# Altium integrated library OMID_DXP_LIB93.IntLib: 684 symbols (part 1 of 5) (continued)
## LCD 8X2 (continued)
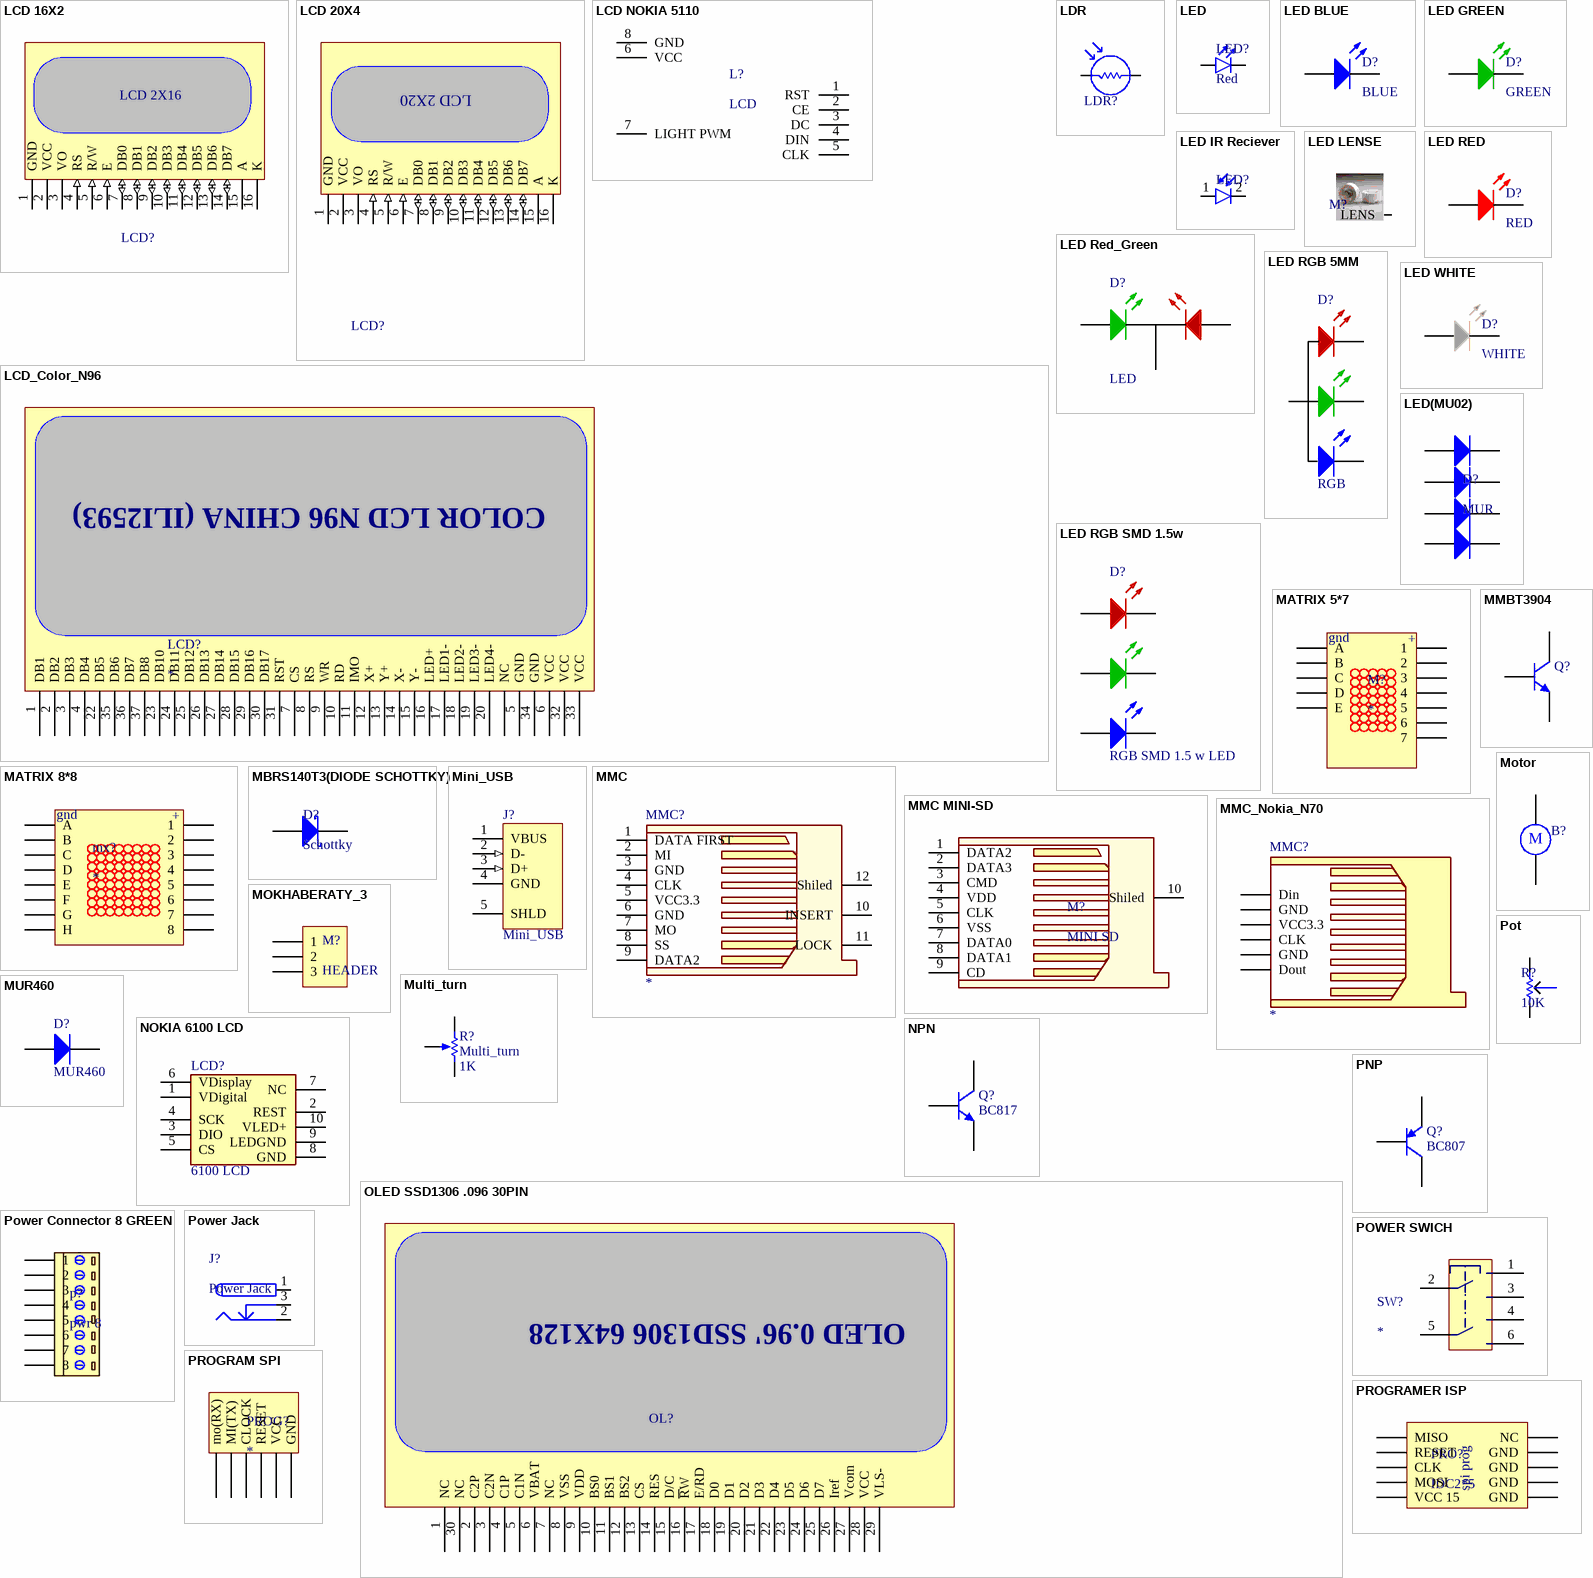
[diagram p4: symbols LCD 16X2 to PROGRAMER ISP]
text: LCD 2X8

## LCD 16X2
designator LCD?  (value not drawn)
LCD 16X2 Character lcd
footprint My_LCD 16x2-A
footprint LCD2*16_VERTICAL
pins: 1 GND (power), 2 VCC (power), 3 VO, 4 RS (in), 5 R/W (in), 6 E (in), 7 DB0 (io), 8 DB1 (io), 9 DB2 (io), 10 DB3 (io), 11 DB4 (io), 12 DB5 (io), 13 DB6 (io), 14 DB7 (io), 15 A, 16 K
text: LCD 2X16

## LCD 20X4
designator LCD?  (value not drawn)
LCD 20X4 Character lcd
footprint My_LCD 20x4-A
footprint My_LCD 20x4-B
pins: 1 GND (power), 2 VCC (power), 3 VO, 4 RS (in), 5 R/W (in), 6 E (in), 7 DB0 (io), 8 DB1 (io), 9 DB2 (io), 10 DB3 (io), 11 DB4 (io), 12 DB5 (io), 13 DB6 (io), 14 DB7 (io), 15 A, 16 K
text: LCD 2X20

## LCD NOKIA 5110
designator L?, comment LCD
48X84 LCD MATRIX
footprint LCD_MODULE5110
pins: 1 RST, 2 CE, 3 DC, 4 DIN, 5 CLK, 6 VCC (power), 7 LIGHT PWM, 8 GND (power)

## LCD_Color_N96
designator LCD?
footprint my_lcd_N96
pins: 1 DB1, 2 DB2, 3 DB3, 4 DB4, 5 GND, 6 VCC, 7 CS, 8 RS, 9 WR, 10 RD, 11 IMO, 12 X+, 13 Y+, 14 X-, 15 Y-, 16 LED+, 17 LED1-, 18 LED2-, 19 LED3-, 20 LED4-, 21 NC, 22 DB5, 23 DB10, 24 DB11, 25 DB12, 26 DB13, 27 DB14, 28 DB15, 29 DB16, 30 DB17, 31 RST, 32 VCC, 33 VCC, 34 GND, 35 DB6, 36 DB7, 37 DB8
text: COLOR LCD N96 CHINA (ILI2593)

## LDR
designator LDR?, comment PhotoCell  (value not drawn)
Photo Cell- Variable Resistor With Light; Company: IPA CO.; Designer: Saeid Jorablo; Last Update Time: 2008/07/17
footprint PhotoCell
pins: 1, 2

## LED
designator LED?, comment Red
LED; Designer: Saeid Jorablo; Organazation: ControTec; Adding Date: 1387/12/22; Size: SMD 1206; Color: Red
footprint LED-3mm
footprint LED-5mm
footprint LED-5mm-IR
footprint LED SMD 1206
footprint LED-RED (LED 3mm Right Angle - Color Red)
footprint LED-GREEN (LED 3mm Right Angle - Color Green)
footprint LED-YELLOW (LED 3mm Right Angle - Color Yellow)
footprint LED 1Watt
pins: 1 A, 2 K

## LED BLUE
designator D?, comment BLUE
LED SMD PACKAGE
footprint 0603 (Chip Capacitor; Body 1.6 x 0.8 mm (LxW typ))
footprint 0805 (Chip Capacitor; Body 2.0 x 1.2 mm (LxW typ))
footprint 1206 (Chip Capacitor; Body 3.2 x 1.6 mm (LxW typ))
footprint LED SMD 1206 BLUE
footprint LED-5mm-BLUE
footprint Model Name (Footprint not found)
pins: 1 A, 2 K

## LED GREEN
designator D?, comment GREEN
LED SMD PACKAGE
footprint 0603 (Chip Capacitor; Body 1.6 x 0.8 mm (LxW typ))
footprint 0805 (Chip Capacitor; Body 2.0 x 1.2 mm (LxW typ))
footprint LED SMD 1206 GREEN
footprint LED-3mm
footprint LED-Green (LED 3mm Right Angle - Color Green)
footprint LED-5mm-Green
pins: 1 A, 2 K

## LED IR Reciever
designator LED?, comment IR Reciever  (value not drawn)
Infra Red Reciever Photo Diode; Designer: Saeid Jorablo; Organazation: ControTec; Adding Date: 1387/12/22
footprint LED-5mm-IR Reciver
footprint LED-5mm-IR
pins: 1 A, 2 K

## LED LENSE
designator M?, comment LENSE  (value not drawn)
LED COVER LENSE
footprint LED LESE
pins: G LENS

## LED RED
designator D?, comment RED
LED SMD PACKAGE
footprint 0603 (Chip Capacitor; Body 1.6 x 0.8 mm (LxW typ))
footprint 0805 (Chip Capacitor; Body 2.0 x 1.2 mm (LxW typ))
footprint 1206 (Chip Capacitor; Body 3.2 x 1.6 mm (LxW typ))
footprint LED SMD 1206
footprint LED-Red (LED 3mm Right Angle - Color Red)
footprint LED-5mm-RED
pins: 1 A, 2 K

## LED Red_Green
designator D?, comment LED
Typical INFRARED GaAs LED; Published: 8-Jun-2000; LatestRevisionDate: 08-Jul-2005; LatestRevisionNote: Mech Layer 1 removed.; Publisher: Altium Limited
footprint My_DUOLED5MM
pins: AG, AR, K

## LED RGB 5MM
designator D?, comment RGB
Enhanced Power RGB LED
footprint LED-RGB-5MM
pins: A, B K, G K, R K

## LED RGB SMD 1.5w
designator D?, comment RGB SMD 1.5 w LED
Enhanced Power RGB LED
footprint MY_RGB_SMD_1.5w
pins: AB A, AG A, AR A, KB K, KG K, KR K

## LED WHITE
designator D?, comment WHITE
LED SMD PACKAGE
footprint 0603 (Chip Capacitor; Body 1.6 x 0.8 mm (LxW typ))
footprint 0805 (Chip Capacitor; Body 2.0 x 1.2 mm (LxW typ))
footprint 1206 (Chip Capacitor; Body 3.2 x 1.6 mm (LxW typ))
footprint LED SMD 1206 WHITE
footprint LED-5mm-IR
pins: 1 A, 2 K

## LED(MU02)
designator D?, comment MUR
4 LED IN INTEGRED PACKAGE
footprint MU02
pins: 1, 2 B, 3 A, 4 A, A K, B K, C K, D K

## MATRIX 5*7
designator M?
MATRIX
footprint my_MATRIX 5*7
pins: 1, 2, 3, 4 (power), 5 (power), 6 (power), 7 (power), A, B, C, D, E
text: gnd; +

## MATRIX 8*8
designator mx?
MATRIX RED
footprint my_dotmatrix8*8
pins: A1 1, A2 2, A3 3, A4 4 (power), A5 5 (power), A6 6 (power), A7 7 (power), A8 8 (power), K1 A, K2 B, K3 C, K4 D, K5 E, K6 F, K7 G, K8 H
text: gnd; +

## MBRS140T3(DIODE SCHOTTKY)
designator D?, comment Schottky
Schottky Power Rectifier
footprint 403A-3
pins: 1 A, 2 K

## Mini_USB
designator J?
USB 2.0, Right Angle, SMT, B Type, Receptacle, 5 Position, Black; ContactMaterial: Copper Alloy; ContactPlating: Gold (30); PCB_Layout: Complies with manufacturer's recommendation.; DrillSize: Corresponds to nominal value.; PanelGround: Without; Published: 15-Jul-2004; DatasheetDocument: 27-Jun-2003; PackageDocument: 27-Jun-2003; PackageReference: 440247; Publisher: Altium Limited; HousingMaterial: Thermoplastic; ComponentLink1Description: Manufacturer Link; ComponentLink1URL: http://www.tycoelectronics.com/; ComponentLink2Description: Packaging Specification; ComponentLink2URL: http://ecommas.tycoelectronics.com/commerce/DocumentDelivery/DDEController?Action=showdoc&DocId=Customer+Drawing%7F440247%7FD%7Fpdf%7FEnglish%7FC_440247_D.pdf
footprint My_USB
signal-integrity model USB2.0
pins: 1 VBUS (power) "Power", 2 D- (in) "-DATA", 3 D+ (in) "+DATA", 4 GND (power) "Ground", 5 SHLD "Shield"

## MMBT3904
designator Q?
NPN Switching Transistor; Published: 17-Sep-2003; LatestRevisionDate: 12-Dec-2006; LatestRevisionNote: IPC-7351 Footprint Added.; DatasheetVersion: 13-May-2002; PackageVersion: May-1999; PackageReference: SOT23; Publisher: Altium Limited; PackageDescription: 3-Pin SOT-23 Package 0.95 mm Pitch, 2.3 mm Lead Span; ComponentLink1Description: Manufacturer Link; ComponentLink1URL: http://www.semiconductors.philips.com/; ComponentLink2Description: Datasheet; ComponentLink2URL: http://www.semiconductors.philips.com/acrobat/datasheets/MMBT3904_4.pdf
footprint SOT23_N (SOT23, 3-Leads, Body 2.9x1.3mm, Pitch 0.95mm, Lead Span 2.3mm, IPC Medium Density)
footprint SOT23_L (SOT23, 3-Leads, Body 2.9x1.3mm, Pitch 0.95mm, Lead Span 2.3mm, IPC High Density)
footprint SOT23_M (SOT23, 3-Leads, Body 2.9x1.3mm, Pitch 0.95mm, Lead Span 2.3mm, IPC Low Density)
signal-integrity model MMBT3904
pins: 1 B, 2 E, 3 C

## MMC
designator MMC?
MMC/SD Card
footprint MY_MMC
footprint MY_SD-MMC_SOCKET-PP
footprint my_mmc mini
pins: 1 DATA FIRST, 2 MI, 3 GND, 4 CLK, 5 VCC3.3, 6 GND, 7 MO, 8 SS, 9 DATA2, 10 INSERT, 11 LOCK, 12 Shiled

## MMC MINI-SD
designator M?, comment MINI SD
MULTI MEDIA CARD SLOT SMD
footprint SD_MINI KESHOOYI
pins: 1 DATA2, 2 DATA3, 3 CMD, 4 VDD, 5 CLK, 6 VSS, 7 DATA0, 8 DATA1, 9 CD, 10 Shiled

## MMC_Nokia_N70
designator MMC?
MMC/SD Card
footprint MY_Nokia_N70_MMC
pins: 2 Din, 3 GND, 4 VCC3.3, 5 CLK, 6 GND, 7 Dout

## MOKHABERATY_3
designator M?, comment HEADER
footprint HEADER_MOKHABERATY_3
pins: 1, 2, 3

## Motor
designator B?
Motor, General Kind; Published: 24-Mar-1999; LatestRevisionDate: 17-Jul-2002; LatestRevisionNote: Re-released for DXP Platform.; PackageReference: RB5-10.5; Publisher: Altium Limited
footprint RB5-10.5 (Motor, General Kind; 2 Leads)
pins: 1, 2
text: M

## Multi_turn
designator R?  value 1K
Potentiometer MULTI TURN; Sim Note: Enter the Resistance value and the set point into parameter fields.; Set Position: 0.5; Published: 8-Jun-2000; LatestRevisionDate: 17-Jul-2002; LatestRevisionNote: Re-released for DXP Platform.; PackageReference: VR5; Publisher: Altium Limited
footprint My_Pot_trim
simulation model POT (Potentiometer)
footprint MY_MULTI
pins: 1 TOP, 2 BOT, 3 TAP
1 alternate drawing of the same symbol

## MUR460
designator D?
8Amp Diode
footprint TO220-2
pins: 1 K, 2 A

## NOKIA 6100 LCD
designator LCD?, comment 6100 LCD
NOKIA 6100 LCD
footprint MY_NOKIA6100_LCD
pins: 1 VDigital, 2 REST, 3 DIO, 4 SCK, 5 CS, 6 VDisplay, 7 NC, 8 GND, 9 LEDGND, 10 VLED+

## NPN
designator Q?, comment BC817
NPN Bipolar Transistor; Published: 8-Jun-2000; LatestRevisionDate: 29-May-2009; LatestRevisionNote: IPC-7351 Footprint Added.; PackageVersion: Aug-1999; PackageReference: SOT-23B; Publisher: Altium Limited; PackageDescription: 3-Pin SOT-23 Package 0.95 mm Pitch, 2.4 mm Lead Span
signal-integrity model NPN
footprint SOT23_BEC_L (SOT23, 3-Leads, Body 2.9x1.3mm, Pitch 0.95mm, Lead Span 2.4mm, IPC High Density)
footprint SOT23_BEC_M (SOT23, 3-Leads, Body 2.9x1.3mm, Pitch 0.95mm, Lead Span 2.4mm, IPC Low Density)
footprint SOT23_BEC_N (SOT23, 3-Leads, Body 2.9x1.3mm, Pitch 0.95mm, Lead Span 2.4mm, IPC Medium Density)
pins: 1 B, 2 E, 3 C

## OLED SSD1306 .096 30PIN
designator OL?  (value not drawn)
footprint OLED 64X128 .96
pins: 1 NC, 2 C2P, 3 C2N, 4 C1P, 5 C1N, 6 VBAT, 7 NC, 8 VSS, 9 VDD, 10 BS0, 11 BS1, 12 BS2, 13 CS, 14 RES, 15 D/C, 16 ~{R}W, 17 E/RD, 18 D0, 19 D1, 20 D2, 21 D3, 22 D4, 23 D5, 24 D6, 25 D7, 26 Iref, 27 Vcom, 28 VCC, 29 VLS-, 30 NC
text: OLED 0.96' SSD1306 64X128

## PNP
designator Q?, comment BC807
PNP Bipolar Transistor; Published: 8-Jun-2000; LatestRevisionDate: 29-May-2009; LatestRevisionNote: IPC-7351 Footprint Added.; PackageVersion: Aug-1999; PackageReference: SOT-23B; Publisher: Altium Limited; PackageDescription: 3-Pin SOT-23 Package 0.95 mm Pitch, 2.4 mm Lead Span
signal-integrity model PNP
footprint SOT23_BEC_N (SOT23, 3-Leads, Body 2.9x1.3mm, Pitch 0.95mm, Lead Span 2.4mm, IPC Medium Density)
footprint SOT23_BEC_M (SOT23, 3-Leads, Body 2.9x1.3mm, Pitch 0.95mm, Lead Span 2.4mm, IPC Low Density)
footprint SOT23_BEC_L (SOT23, 3-Leads, Body 2.9x1.3mm, Pitch 0.95mm, Lead Span 2.4mm, IPC High Density)
pins: 1 B, 2 E, 3 C

## Pot
designator R?, comment 10K
POT; VALUE: 10K
footprint my_pot - duplicate
footprint my_pot2
footprint my_vol
footprint POT-SMD
pins: 1, 2, 3

## Power Connector 8 GREEN
designator p?, comment pwr 8
GREEN Power Connector 8PIN RIGHT ANGLE
footprint my_power_8
pins: 1, 2, 3, 4, 5, 6, 7, 8

## Power Jack
designator J?
Designer: Saeid Jorablo; Company: Personal; Project Name: Laser; Adding Date: 10/21/2009
footprint Power Jack
pins: 1 (power), 2 (power), 3 (power)

## POWER SWICH
designator SW?
footprint MY_POWER_SW
pins: 1, 2, 3, 4, 5, 6

## PROGRAM SPI
designator PROG?
2*5 IDC MAILE ON BOARD
footprint My_1X06
pins: 1 mo(RX), 2 MI(TX), 3 CLOCK, 4 RESET, 5 VCC, 6 GND

## PROGRAMER ISP
designator PRO?, comment IDC2*5
MAILE 2*5 IDC BOX
footprint MY_ISP_PROG
pins: 1 MISO, 2 NC, 3 RESET, 4 GND, 5 CLK, 6 GND, 7 MOSI, 8 GND, 9 VCC 15, 10 GND
text: spi prog

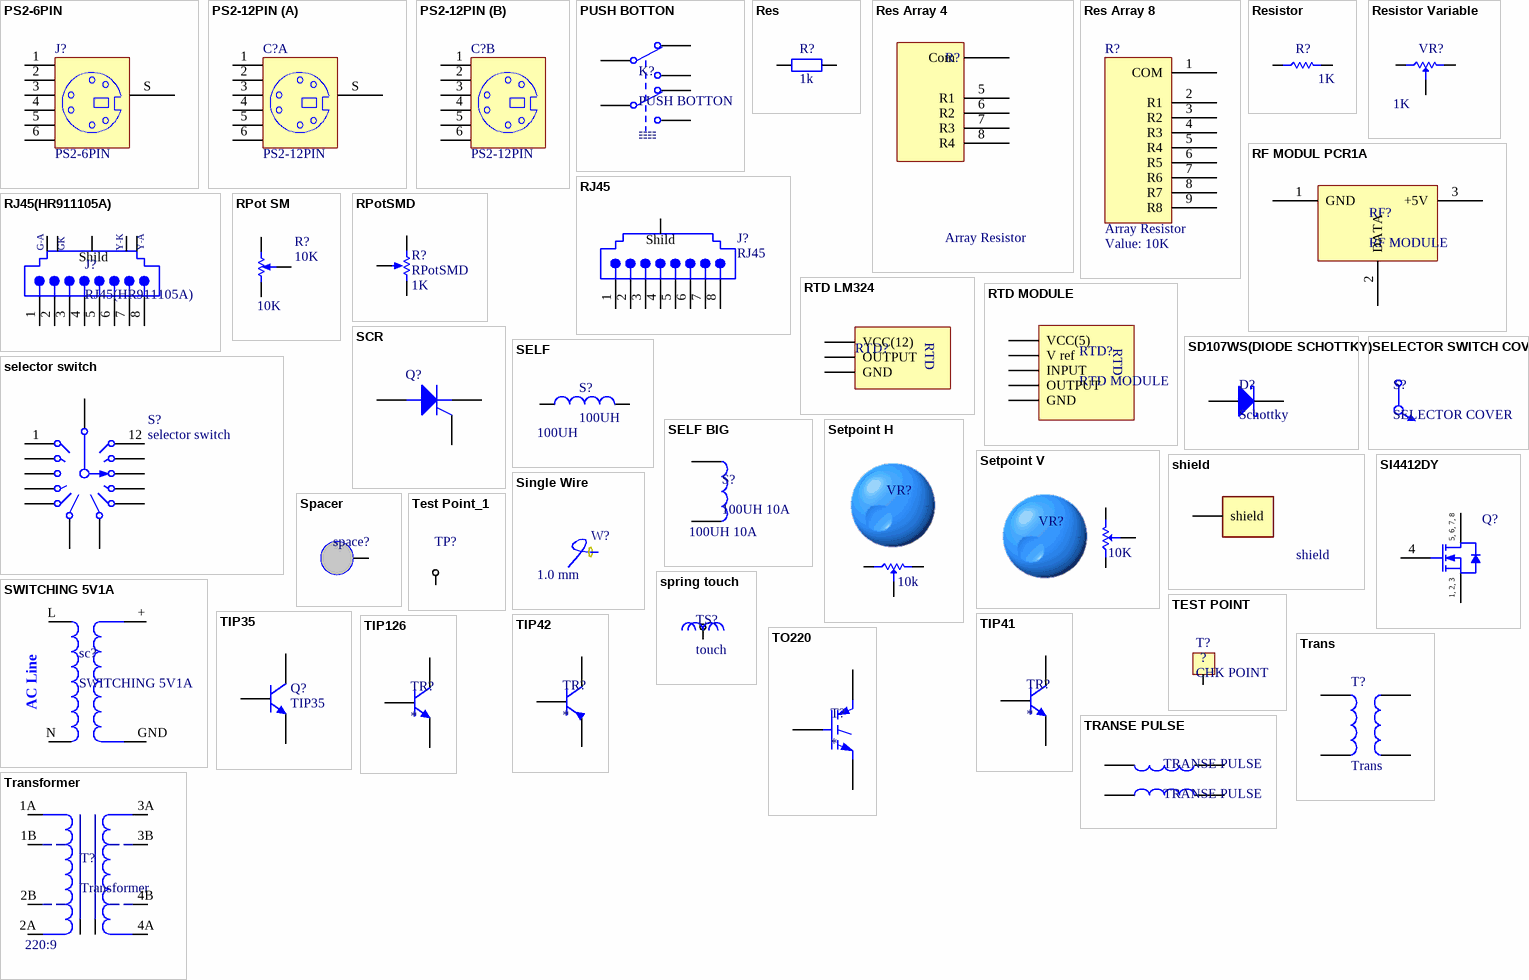
[diagram p5: symbols PS2-6PIN to Transformer]

## PS2-6PIN
designator J?
6 Pin Through Hole PS2 Socket (Kycon P/N); Published: 17-Dec-2003; Publisher: Altium Limited; ComponentLink1Description: Manufacturer Link; ComponentLink1URL: http://www.oupiin.com/prodindx.html#Headers
footprint My_PS2-6PIN
pins: 1, 2, 3, 4, 5, 6, S

## PS2-12PIN
designator C?
12 Pin Through Hole PS2 Socket (
footprint My_PS2_2
part A pins: 1, 2, 3, 4, 5, 6, S
part B pins: 7 1, 8 2, 9 3, 10 4, 11 5, 12 6

## PUSH BOTTON
designator K?
PUSH BOTON DOUBLE
footprint PUSH BOTTON
pins: 1 NC, 2 COM, 3 NO, 4 NC, 5 COM, 6 NO
text: ----

## Res
designator R?, comment 1k
Resistor; Tolerance: 5%; Power: 1/8 W; Value: 1k
simulation model Model Name (Model Description)
footprint Res-(1/8)
footprint Res-(1/4)
footprint Res-(1/2)
footprint Res-(1/1)
footprint Res-(2/1)
footprint RES 0201 (0603X03L) (Chip Resistor, 2-Leads, Body 0.6x0.3mm, IPC High Density (0.05 W))
footprint RES 0402 (1005X04L) (Chip Resistor, 2-Leads, Body 1.0x0.5mm, IPC High Density _ (0.031/0.063 W))
footprint RES 0603 (1608X06L) (Chip Resistor, 2-Leads, Body 1.6x0.8mm, IPC High Density _ (0.063W))
footprint RES 0805 (2012X06L) (Chip Resistor, 2-Leads, Body 2.0x1.3mm, IPC High Density _ (0.100 W))
footprint RES 1206 (3216X08L) (Chip Resistor, 2-Leads, Body 3.2x1.6mm, IPC High Density _ (0.125 W))
footprint RES 1210 (3226X07L) (Chip Resistor, 2-Leads, Body 3.2x2.6mm, IPC High Density _ (0.250 W))
footprint RES 1217 (3042X09L) (Chip Resistor, 2-Leads, Body 3.0x4.2mm, IPC High Density _ (0.250 W))
footprint RES 2010 (5026X08L) (Chip Resistor, 2-Leads, Body 5.0x2.6mm, IPC High Density _ (0.250 W))
footprint RES 2020 (5151X09L) (Chip Resistor, 2-Leads, Body 5.1x5.1mm, IPC High Density _ (0.5 W))
footprint RES 2045 (50115X09L) (Chip Resistor, 2-Leads, Body 5.0x11.5mm, IPC High Density _ (1.0 W))
footprint RES 2512 (6331X07L) (Chip Resistor, 2-Leads, Body 6.3x3.1mm, IPC High Density _ (0.500 W))
footprint Res-(1/4)-Stand
footprint Res-(5/1)-Stand
footprint SMD_RES_0603 (Chip Resistor, 2-Leads, Body 1.6x0.8mm, IPC High Density _ (0.063W))
footprint SMD_RES_0805 (Chip Resistor, 2-Leads, Body 2.0x1.3mm, IPC High Density _ (0.100 W))
footprint SMD_RES_1206 (Chip Resistor, 2-Leads, Body 3.2x1.6mm, IPC High Density _ (0.125 W))
pins: 1, 2

## Res Array 4
designator R?, comment Array Resistor
Resistor Pack SMD 1206 4 CHANELL
footprint RES ARRAY 1206
footprint Res_Array 4
pins: 1 Com, 5 R1, 6 R2, 7 R3, 8 R4

## Res Array 8
designator R?, comment Array Resistor  value 10K
Resistor Pack
footprint Res Array
pins: 1 COM, 2 R1, 3 R2, 4 R3, 5 R4, 6 R5, 7 R6, 8 R7, 9 R8

## Resistor
designator R?, comment 1K
Resistor; Tolerance: 5%; Power: 1/8 W; Value: 1K
simulation model Model Name (Model Description)
footprint Res-(1/8)
footprint Res-(1/4)
footprint Res-(1/2)
footprint Res-(1/1)
footprint Res-(2/1)
footprint RES 0201 (0603X03L) (Chip Resistor, 2-Leads, Body 0.6x0.3mm, IPC High Density (0.05 W))
footprint RES 0402 (1005X04L) (Chip Resistor, 2-Leads, Body 1.0x0.5mm, IPC High Density _ (0.031/0.063 W))
footprint RES 0603 (1608X06L) (Chip Resistor, 2-Leads, Body 1.6x0.8mm, IPC High Density _ (0.063W))
footprint RES 0805 (2012X06L) (Chip Resistor, 2-Leads, Body 2.0x1.3mm, IPC High Density _ (0.100 W))
footprint RES 1206 (3216X08L) (Chip Resistor, 2-Leads, Body 3.2x1.6mm, IPC High Density _ (0.125 W))
footprint RES 1210 (3226X07L) (Chip Resistor, 2-Leads, Body 3.2x2.6mm, IPC High Density _ (0.250 W))
footprint RES 1217 (3042X09L) (Chip Resistor, 2-Leads, Body 3.0x4.2mm, IPC High Density _ (0.250 W))
footprint RES 2010 (5026X08L) (Chip Resistor, 2-Leads, Body 5.0x2.6mm, IPC High Density _ (0.250 W))
footprint RES 2020 (5151X09L) (Chip Resistor, 2-Leads, Body 5.1x5.1mm, IPC High Density _ (0.5 W))
footprint RES 2045 (50115X09L) (Chip Resistor, 2-Leads, Body 5.0x11.5mm, IPC High Density _ (1.0 W))
footprint RES 2512 (6331X07L) (Chip Resistor, 2-Leads, Body 6.3x3.1mm, IPC High Density _ (0.500 W))
footprint Res-(1/4)-Stand
footprint Res-(5/1)-Stand
footprint SMD_RES_0603 (Chip Resistor, 2-Leads, Body 1.6x0.8mm, IPC High Density _ (0.063W))
footprint SMD_RES_0805 (Chip Resistor, 2-Leads, Body 2.0x1.3mm, IPC High Density _ (0.100 W))
footprint SMD_RES_1206 (Chip Resistor, 2-Leads, Body 3.2x1.6mm, IPC High Density _ (0.125 W))
pins: 1, 2

## Resistor Variable
designator VR?, comment 1K
Variable Resistor; Designer: Saeid Jorablo; Company: ControTec; Adding Date: 137/12/22; Value: 1K
footprint Pot 00
footprint Multi Turn 02
pins: 1 CCW, 2 CW, 3 Setpoint

## RF MODUL PCR1A
designator RF?, comment RF MODULE
PCR1A MAX BAUD=1000
footprint PCR1A
pins: 1 GND (power), 2 DATA (power), 3 +5V (power)

## RJ45
designator J?
Right Angle, Standard Profile, RJ45-Keyed, Flange Mount PCB Jack; Ports: 1; Positions/Loaded: Port1 - 8 Keyed/8; PerformanceCategory: 3; PCB_Mounting: Thru-Hole; ComponentAvailability: Obsolete; DrillSize: Nominal, Rounded to nearest 0.05mm; PCB_Layout: Complies with Manufacturer's Recommendation.; Published: 25-Jun-2002; DatasheetDocument: 18-Dec-2001; PackageDocument: 18-Dec-2001; PackageReference: 15-43-6233; Publisher: Altium Limited; ComponentLink1Description: Manufacturer Link; ComponentLink1URL: http://www.molex.com/; ComponentLink2Description: Datasheet; ComponentLink2URL: http://www.molex.com/cmc_upload/common_files/1212003_catalogmx41314.pdf; ComponentLink3Description: Iges Model; ComponentLink3URL: http://www.molex.com/pdm_docs/igs/15-43-6233_igs.zip
footprint My_RJ45
signal-integrity model Modular Jack
pins: 1, 2, 3, 4, 5, 6, 7, 8, shild Shild

## RJ45(HR911105A)
designator J?
SINGLE PORT RJ45 WITH MAGNATIC MODULE AND LED
footprint RJ45-HR911105A
pins: 1, 2, 3, 4, 5, 6, 7, 8, 9 G1, 10 G2, 11 Y1, 12 Y2, shild Shild
text: G-A; GK; Y-K; Y-A

## RPot SM
designator R?, comment 10K
Square Trimming Potentiometer; Published: 17-Dec-2003; DatasheetVersion: Oct-2003; PackageReference: POT4MM-2; Publisher: Altium Limited; PackageDescription: Square Trimming Potentiometer; ComponentLink1Description: Manufacturer Link; ComponentLink1URL: http://bourns.com/2/search.html; Value: 10K
footprint POT4MM-Small Pot (Square Trimming Potentiometer)
footprint POT4MM-Triming (Square Trimming Potentiometer)
pins: CCW -, CW +, W
1 alternate drawing of the same symbol

## RPotSMD
designator R?  value 1K
Potentiometer; Sim Note: Enter the Resistance value and the set point into parameter fields.; Set Position: 0.5; Published: 8-Jun-2000; LatestRevisionDate: 17-Jul-2002; LatestRevisionNote: Re-released for DXP Platform.; PackageReference: VR5; Publisher: Altium Limited
footprint My_Pot
simulation model POT (Potentiometer)
footprint MY_TRIM_POT
pins: 1 TOP, 2 BOT, 3 TAP
1 alternate drawing of the same symbol

## RTD LM324
designator RTD?  (value not drawn)
LM324AD-2K2*3-33K*2-1N4148*2-6K8-470R-150K*2-100K*2-100N*3-MULTITURN-RIGHT200R(ALL RES AND CAP IS 1206 )
footprint RTD_PT100_LM324 (DESIGNED LM324 AND SMD COMPONENTS)
pins: RTD-GND GND, RTD-OUT OUTPUT, RTD-VCC VCC(12)
text: RTD

## RTD MODULE
designator RTD?
LM358-1K*4-PC817-10K-3K3-2K7-1N-1UF-100N-150R
footprint RTD LM358 KOOHESTANI
pins: G GND, OUT OUTPUT, SEN INPUT, VDD VCC(5), VR V ref
text: RTD

## SCR
designator Q?
Silicon Controlled Rectifier; Published: 8-Jun-2000; LatestRevisionDate: 17-Jul-2002; LatestRevisionNote: Re-released for DXP Platform.; PackageReference: TO-220-AB; Publisher: Altium Limited; Code_JEDEC: TO-220-AB
footprint my_7805
simulation model SCR (Spice Subcircuit)
pins: 1 K, 2 A, 3 G

## SD107WS(DIODE SCHOTTKY)
designator D?, comment Schottky
Schottky Power Rectifier
footprint SD107WS
pins: 1 A, 2 K

## selector switch
designator S?
12 Way Switch; Published: 24-Mar-1999; LatestRevisionDate: 17-Jul-2002; LatestRevisionNote: Re-released for DXP Platform.; PackageReference: DIP-13(14); Publisher: Altium Limited
footprint SELECTOR-SWITCH12
pins: 1, 2, 3, 4, 5, 6, 7, 8, 9, 10, 11, 12, com

## SELECTOR SWITCH COVER
designator S?, comment SELECTOR COVER
footprint SELECTOR_SWITCH_UPPERCASE

## SELF
designator S?, comment 100UH
INDUCTOR; VALUE: 100UH
footprint My_axial-0.4
footprint 12-1812 (Chip Resistor; Body 4.5 x 3.2 mm (LxW typ))
footprint L-smd
footprint SELF 9*12
pins: 1, 2

## SELF BIG
designator S?, comment 100UH 10A
INDUCTOR; VALUE: 100UH 10A
footprint self 8*10
pins: 1, 2

## Setpoint H
designator VR?, comment 10k
Variable Resistor; Designer: Saeid Jorablo; Company: *; Value: 10k
footprint Setpoint POT
pins: 1 CCW, 2 CW, 3 Setpoint

## Setpoint V
designator VR?, comment 10K
Variable Resistor; Designer: Saeid Jorablo; Company: *; Value: 10K
footprint Setpoint POT
pins: 1 CCW, 2 CW, 3 SetPoint

## shield
designator shield  (value not drawn)
footprint shield
pins: shield (power)

## SI4412DY
designator Q?
N-Channel 30V (D-S)  Rated MOSFET; Published: 8-Jun-2000; LatestRevisionDate: 13-Apr-2006; LatestRevisionNote: IPC-7351 Footprint Added.; DatasheetVersion: 6-Oct-1997; PackageVersion: Aug-1998; PackageReference: SO-8; Publisher: Altium Limited; PackageDescription: 8-Pin Small Outline Integrated Circuit 1.27 mm Pitch; ComponentLink1Description: Manufacturer Link; ComponentLink1URL: http://www.vishay.com/; ComponentLink2Description: Datasheet; ComponentLink2URL: http://www.vishay.com/docs/70154/70154.pdf
footprint SO-8_N (SOIC, 8-Leads, Body 4.9x3.9mm, Pitch 1.27mm, IPC Medium Density)
footprint SO-8_L (SOIC, 8-Leads, Body 4.9x3.9mm, Pitch 1.27mm, IPC High Density)
footprint SO-8_M (SOIC, 8-Leads, Body 4.9x3.9mm, Pitch 1.27mm, IPC Low Density)
3D model SO-8 (8-Pin Small Outline Integrated Circuit 1.27 mm Pitch)
simulation model SI4412DY (SUBCKT)
pins: 1 S, 2 S, 3 S, 4 G, 5 D, 6 D, 7 D, 8 D
text: 5, 6, 7, 8; 1, 2, 3

## Single Wire
designator W?  Diameter: 1.0 mm  (hidden comment: *)
A Customize Component For Single Wire Connection; Designer: Saeid Jorablo; Company: IPA Co; Adding Date: 1388/04/05; Color: Blue; Wire Name: *
footprint wire 1.0 mm
footprint wire 1.5 mm
footprint wire 2.0 mm
pins: 1 W

## Spacer
designator space?
10MM SPACER
footprint my_space
footprint SPACER RIGHT ANGLE (RIGHT ANGLE 5MM SPACER)
pins: 0

## spring touch
designator TS?, comment touch
the 100mm spring to get magnetic
footprint spring touch (10 mm sprin wire)
pins: 1 T

## SWITCHING 5V1A
designator sc?
220VOLT TO 5V 1A
footprint Model Name (Footprint not found)
footprint 220<>5V1A
footprint 220<>5V1A - IRAN-PRIZ
pins: +, GND, L, N
text: AC Line

## TEST POINT
designator T?, comment CHK POINT
THIS IS NOT COMPONNENT
footprint MY_TST
footprint MY_TST_SMD
pins: 1
text: ?

## Test Point_1
designator TP?, comment Test Point  (value not drawn)
footprint Test Point
footprint Test Point Small
footprint Test_Pin
pins: 1 T

## TIP35
designator Q?
power npn transistor
footprint My_TOP3
pins: B, C, E

## TIP41
designator TR?
COMPLEMENTARY SILICON POWER  TRANSISTORS
footprint my_7805
pins: 1 B, 2 C, 3 E

## TIP42
designator TR?
COMPLEMENTARY SILICON POWER  TRANSISTORS
footprint my_7805
pins: 1 B, 2 C, 3 E

## TIP126
designator TR?
footprint my_7805
pins: 1 B, 2 C, 3 E

## TO220
designator T?
footprint my_7805
footprint My_TO-220
pins: 1 G, 2 C, 3 E

## Trans
designator T?
Transformer; Published: 24-Mar-1999; LatestRevisionDate: 08-Jul-2005; LatestRevisionNote: Mech Layer 1 removed.; PackageReference: TRANS; Publisher: Altium Limited; PackageDescription: Transformer; 4 Leads
simulation model TRANSFORMER (Transformer)
footprint my_trans
pins: 1, 2, 3, 4

## TRANSE PULSE
designator TRANSE PULSE
ISOLATION TRANSE PULSE
footprint transe_pulse10A
footprint TRANSE_PULSE15A
footprint TRANSE_PULSE2A
pins: 1, 2, 3, 4

## Transformer
designator T?  Voltage Ratio: 220:9
Designer: Eng. Saeid Jorablo; Company: DASE CO; Power: 100W; Adding Date: 10/27/2010
footprint Trans- Small
pins: 1A, 1B, 2A, 2B, 3A, 3B, 4A, 4B, SA, SB

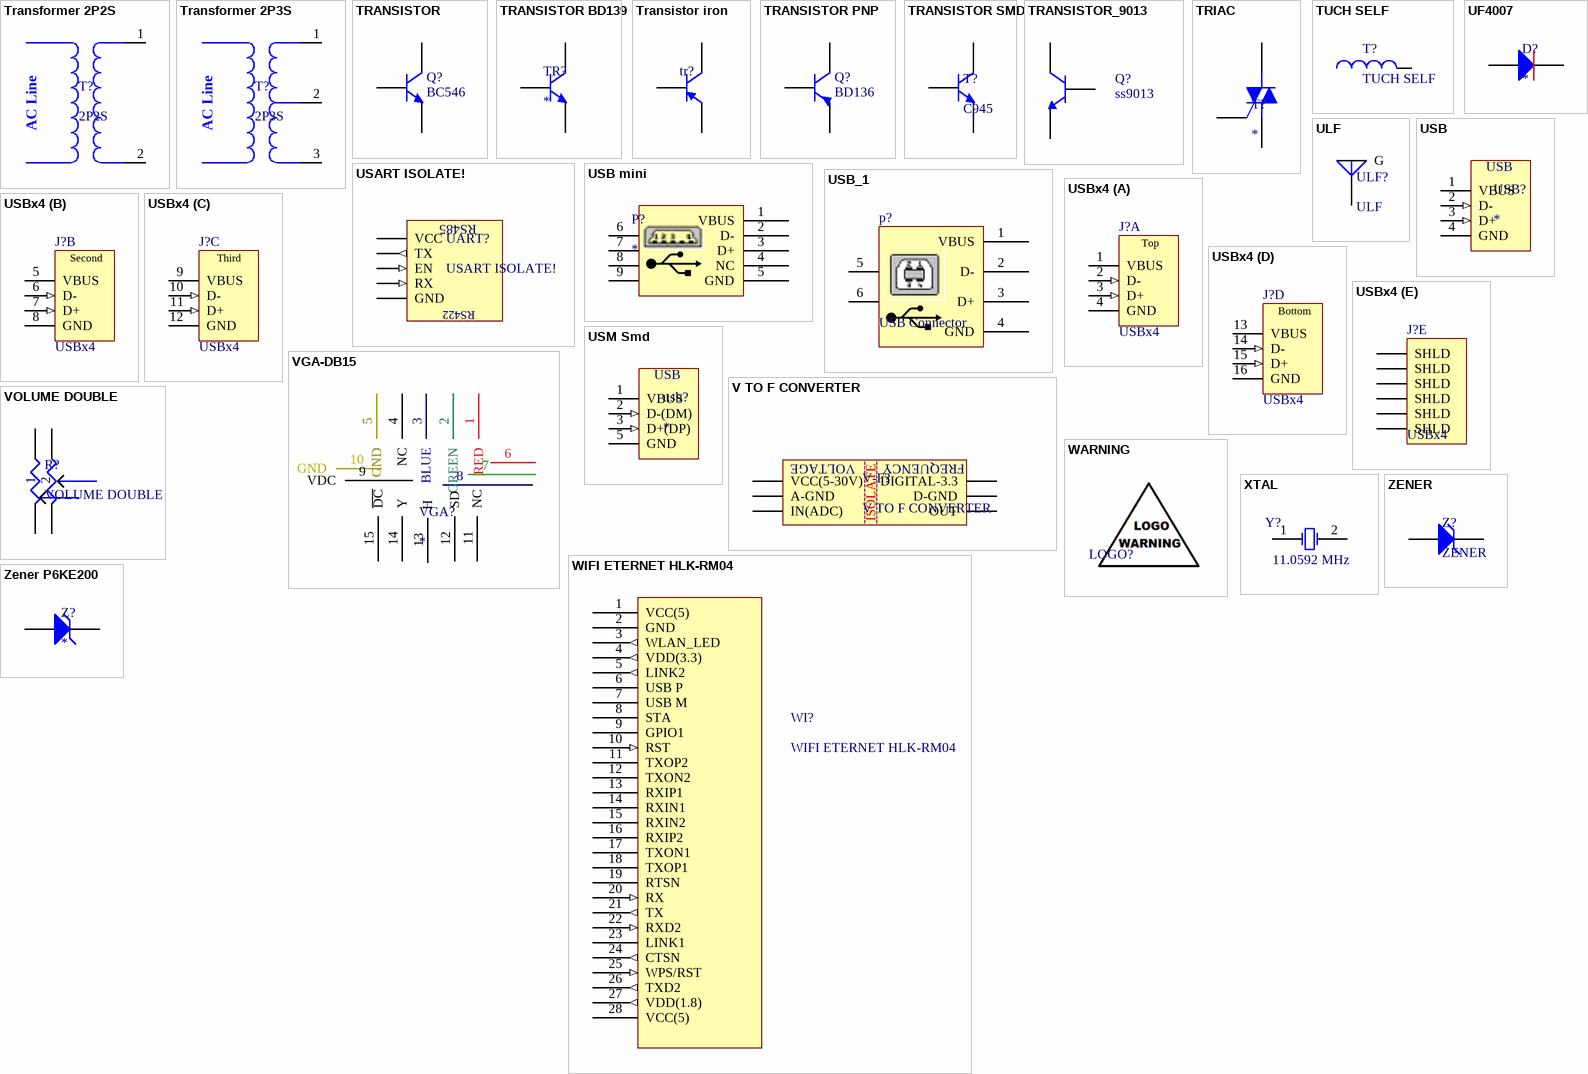
[diagram p6: symbols Transformer 2P2S to Zener P6KE200]

## Transformer 2P2S
designator T?, comment 2P2S
Transformer 2 Primary , 2 Secondry; Designer: Saeid jorablo; Company: ControTEK; Voltage Ratio: 220:9; Power: 100W; Adding Date: 1387/01/22
footprint Socket Blue 2
pins: 1, 2
text: AC Line

## Transformer 2P3S
designator T?, comment 2P3S
Transformer 2 Primary , 3 Secondry; Designer: Saeid Jorablo; Company: ControTEK; Voltage Ratio: 220:9; Power: 72W; Adding Date: 1387/01/22
footprint Socket Blue 3
pins: 1, 2, 3
text: AC Line

## TRANSISTOR
designator Q?, comment BC546
Darlington transistor
footprint my_tr
pins: 1 C, 2 E, 3 B

## TRANSISTOR BD139
designator TR?
footprint my_7805
pins: 1 E, 2 C, 3 B

## Transistor iron
designator tr?  (value not drawn)
footprint my_tr iron
pins: 1 C, 2 B, 3 E

## TRANSISTOR PNP
designator Q?, comment BD136
Darlington transistor
footprint my_tr
pins: 1 C, 2 E, 3 B

## TRANSISTOR SMD
designator T?, comment C945
SMD TRANSISTOR PACKAGE; VALUE: C945
footprint SOT-23 (SOT-23; 3 Leads; Body 3.0 x 2.6 mm, inc. leads (LxW max))
pins: B, C, E

## TRANSISTOR_9013
designator Q?, comment ss9013
Darlington transistor
footprint my_tr
pins: 1 E, 2 C, 3 B

## TRIAC
designator T?
footprint MY_TRIAC
pins: 1 M1, 2 M2, 3 G

## TUCH SELF
designator T?
8 DOR SIM NAZOK B GHOTRE 1.2 CM
footprint TUCH_SELF (8 DOOR SIM NAZOK BE GHOTRE HDOODE 1.2CM)
pins: 1

## UF4007
designator D?
VERY FAST DIODE
footprint my_uf4007
pins: A, K

## ULF
designator ULF?
footprint ULF
footprint BNC
pins: 1 G, 2 A

## USART ISOLATE!
designator UART?
ADM2576-100N*4-10N*2-10UF*2-100K*4-JUMPER*2-TERMINAL4
footprint USART ISOLATE
pins: EN_RS EN (in), GND_RS GND, RX_RS RX (in), TX_RS TX (out), VCC_RS VCC
text: RS485; RS422

## USB
designator USB?
USB CUBE ON BOARD
footprint my_USB - duplicate
footprint MY_USB2
footprint usb maile (maile usb on board)
pins: 1 VBUS (power) "Power", 2 D- (in) "-DATA", 3 D+ (in) "+DATA", 4 GND (power) "Ground"

## USB mini
designator P?
mini USB Connector
footprint mini USB Connector
footprint SMD_Mini USB Connector
footprint USB/SM0.8-6H5 (Connector; USB2.0, Type B, SM; 5 Position; Right Angle)
pins: 1 VBUS (power), 2 D-, 3 D+, 4 NC (power), 5 GND (power), 6, 7, 8, 9

## USB_1
designator p?, comment USB Connector
USB Connector-B Type; Designer: Eng. Saeid Jorablo; Company: DASE Co; Adding Date: 10/26/2010
footprint USB2.5-2H4D (Connector; USB1.1, Type B, Thru-Hole; 4 Position; Right Angle)
footprint USB2.5-2H4E (Connector; USB1.1, Type B, Thru-Hole; 4 Position; Right Angle)
footprint USB2.5-2H4F (Connector; USB1.1, Type B, Thru-Hole; 4 Position; Right Angle)
footprint USB2.5-2H4G (Connector; USB1.1, Type B, Thru-Hole; 4 Position; Right Angle)
footprint USB2.5-2V4 (Connector; USB1.1, Type B, Thru-Hole; 4 Position; Vertical)
footprint USB2.5-4V4 (Connector; USB1.1, Type B, Thru-Hole; 4 Position; Vertical)
footprint USB/SM1.25-4H4 (Connector; USB1.1, Type B, SM; 4 Position; Right Angle)
pins: 1 VBUS (power), 2 D-, 3 D+, 4 GND (power), 5, 6

## USBx4
designator J?
USB 1.1, Right Angle, Thru-Hole, A Type, Receptacle, 4x4x4x4 Position, Fourfold Stacked, Black; ContactMaterial: Phosphor Bronze; ContactPlating: Gold (30) over Nickel (50); TerminationLength: 2.36mm [0.093in.]; PCB_Layout: Complies with manufacturer's recommendation.; DrillSize: Corresponds to nominal value.; PanelGround: Without; Published: 15-Jul-2004; DatasheetDocument: 30-Jul-2002; PackageDocument: 30-Jul-2002; PackageReference: 1470007; Publisher: Altium Limited; HousingMaterial: 30% Glass-Filled Thermoplastic; ComponentLink1Description: Manufacturer Link; ComponentLink1URL: http://www.tycoelectronics.com/; ComponentLink2Description: Packaging Specification; ComponentLink2URL: http://ecommas.tycoelectronics.com/commerce/DocumentDelivery/DDEController?Action=showdoc&DocId=Customer+Drawing%7F1470007%7FO%7Fpdf%7FEnglish%7FENG_CD_1470007_O.pdf
footprint My_USB_4
signal-integrity model USB1.1
part A pins: 1 VBUS (power) "Power", 2 D- (in) "-DATA", 3 D+ (in) "+DATA", 4 GND (power) "Ground"
part B pins: 5 VBUS (power) "Power", 6 D- (in) "-DATA", 7 D+ (in) "+DATA", 8 GND (power) "Ground"
part C pins: 9 VBUS (power) "Power", 10 D- (in) "-DATA", 11 D+ (in) "+DATA", 12 GND (power) "Ground"
part D pins: 13 VBUS (power) "Power", 14 D- (in) "-DATA", 15 D+ (in) "+DATA", 16 GND (power) "Ground"
part E pins: 17 SHLD "Shield", 18 SHLD "Shield", 19 SHLD "Shield", 20 SHLD "Shield", 21 SHLD "Shield", 22 SHLD "Shield"
part A text: Top
part B text: Second
part C text: Third
part D text: Bottom

## USM Smd
designator usb?
smd usb
footprint My_USB
pins: 1 VBUS (power) "Power", 2 D-(DM) (in) "-DATA", 3 D+(DP) (in) "+DATA", 5 GND (power) "Ground"
text: USB

## V TO F CONVERTER
designator V-F?
V->F CONVERTER(1K*2-4N37-AD654-BEAD-FUSE-LED-270-120-100N-200P-6K8-VARIABLE RESISTOR)
footprint V <> F CONVERTER
pins: 5V VCC(5-30V), ADC IN(ADC), F_OUT OUT, GND-3V3 D-GND, GND-5V A-GND, VCC-3V3 DIGITAL-3.3
text: VOLTAGE; FREQUENCY; --------------; ISOLATE

## VGA-DB15
designator VGA?
footprint my_VGA-db15
pins: 1 RED, 2 GREEN, 3 BLUE, 4 NC, 5 GND, 6 R GND, 7 G GND, 8 B GND, 9 VDC, 10 GND, 11 NC, 12 SD, 13 H, 14 Y, 15 ~{DC}

## VOLUME DOUBLE
designator R?
DOUBLE VOLUME
footprint VOLUME_DOUBLE
pins: 1, 2, 3, 4, 5, 6

## WARNING
designator LOGO?, comment Warning!  (value not drawn)  (no BOM)
WARNING & LOGO; Company: E.P.I.L; Design Date: 11/6/2011; Value: Warning!
footprint LOGO SPEAKER
footprint LOGO USB
footprint WARNING
footprint WARNING ESD
footprint LOGO RESET
footprint LOGO Saeid
footprint waning_battry
footprint WARNING_RAKHSH
footprint WARNING_RAKHSH2
footprint WARNING_RAKHSH3
footprint WARNING_RAKHSH4
footprint WARNING_RAKHSH5
footprint WARNING_RAKHSH6
footprint WARNING_RAKHS_92-1
footprint WARNING_RAKSH_92-2
footprint WARNING_RAKSH_92-3

## WIFI ETERNET HLK-RM04
designator WI?
footprint HLK-RM04
pins: 1 VCC(5) (power), 2 GND (power), 3 WLAN_LED (out), 4 VDD(3.3) (out), 5 LINK2 (out), 6 USB P, 7 USB M, 8 STA, 9 GPIO1, 10 RST (in), 11 TXOP2, 12 TXON2, 13 RXIP1, 14 RXIN1, 15 RXIN2, 16 RXIP2, 17 TXON1, 18 TXOP1, 19 RTSN, 20 RX (in), 21 TX (out), 22 RXD2 (in), 23 LINK1, 24 CTSN (out), 25 WPS/RST (in), 26 TXD2 (out), 27 VDD(1.8) (out), 28 VCC(5) (power)

## XTAL
designator Y?, comment 11.0592 MHz
XTAL Crystal; Company: E.P.I.L; Design Date: 11/04/2011; Value: 11.0592 MHz
footprint Crystal SMD
footprint XTAL
footprint XTAL Small
footprint XTAL RTC
pins: 1 OSC1, 2 OSC2

## ZENER
designator Z?
ZENER DIODE
footprint my_1n4148
footprint Diode 1N4007_Stand
footprint LL4148 (MELF Diode, 2-Leads, Body 3.5x1.4mm, IPC Medium Density)
pins: 1 A, 2 K

## Zener P6KE200
designator Z?
footprint Diode-1n4148
footprint Diode-1n4148 - SMD PAD
footprint Diode 1N4007_Stand
pins: 1 A, 2 K


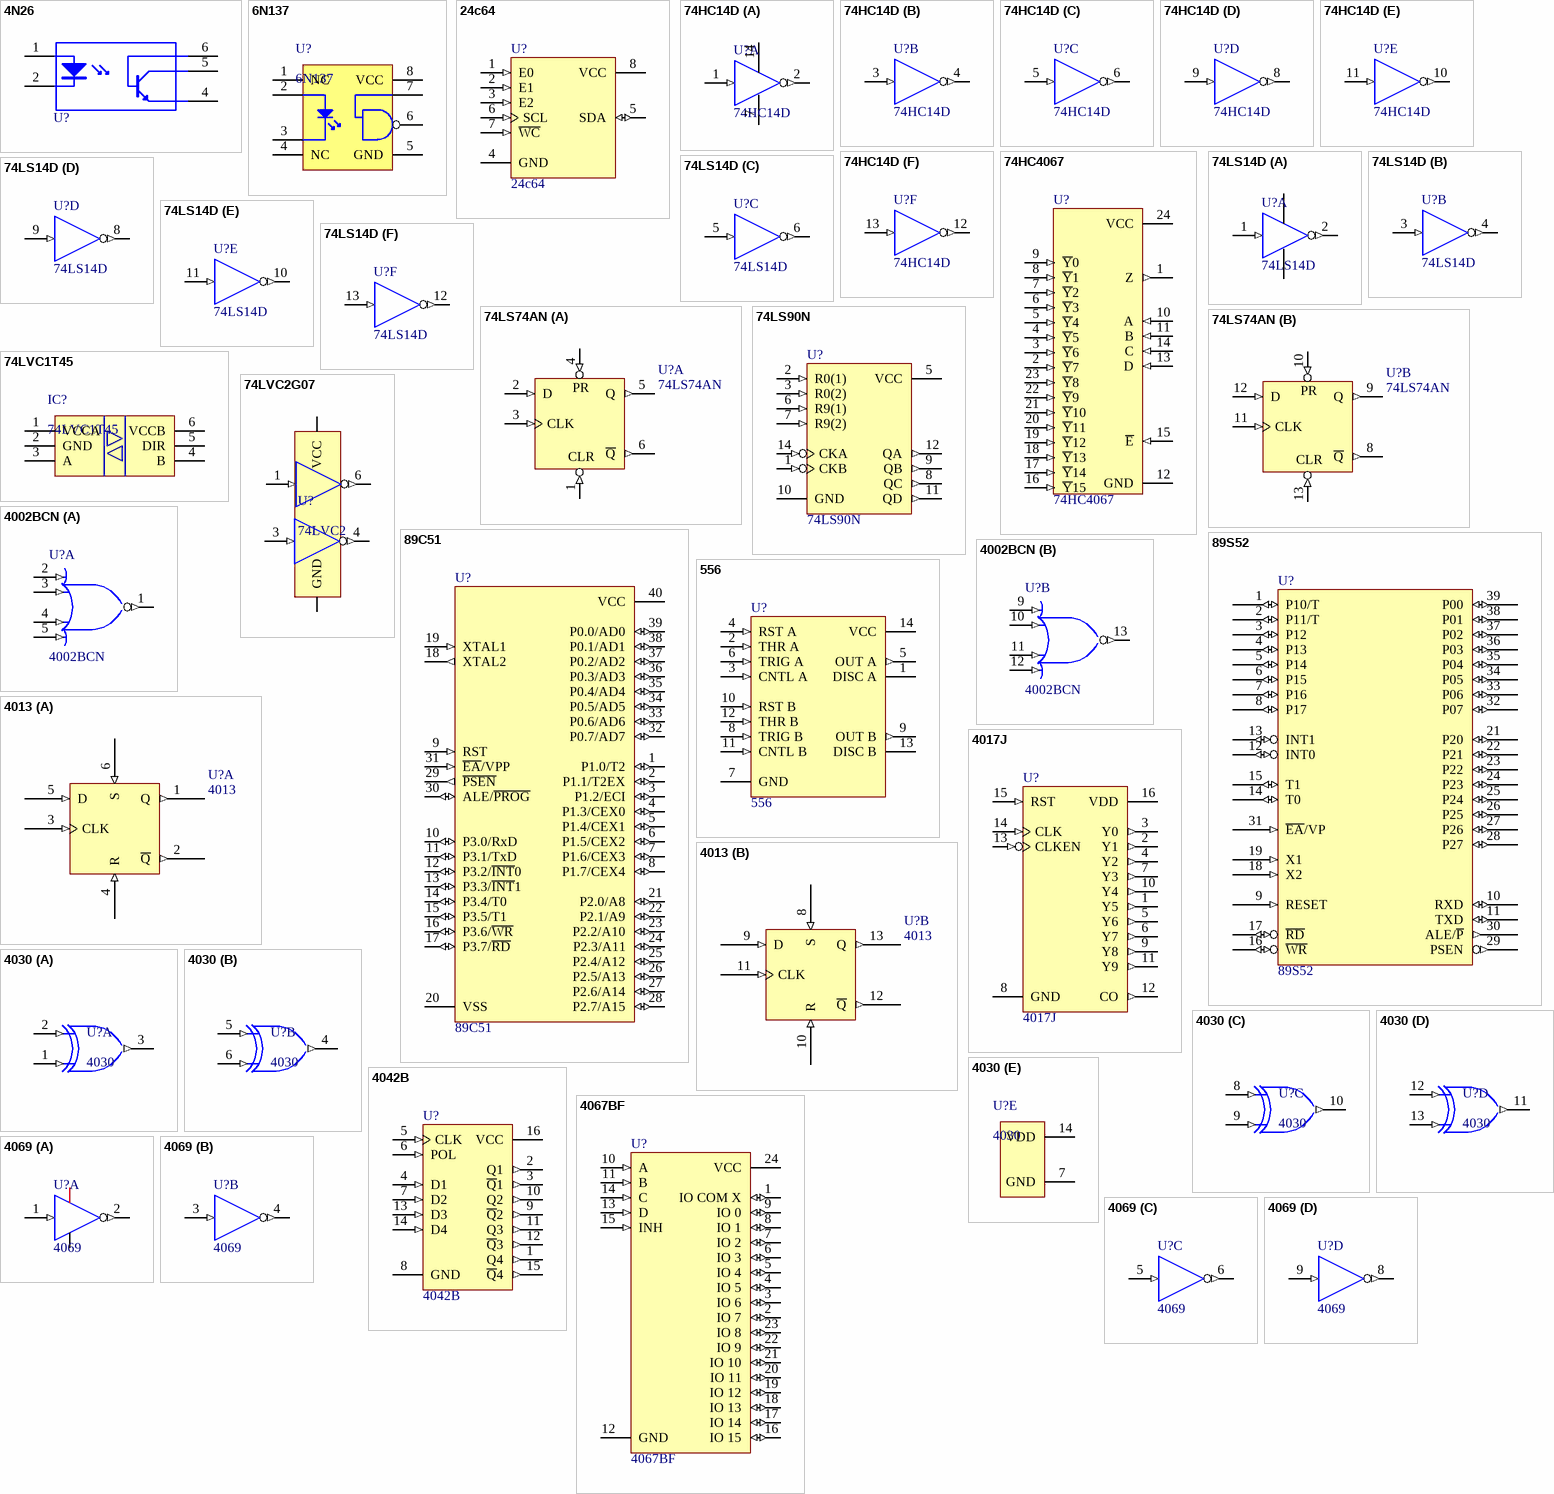
[diagram p7: symbols 4N26 to 4069]

## 4N26
designator U?  (value not drawn)
Opto Coupler
footprint 4N26
pins: 1 A, 2 K, 4 E, 5 C, 6 B

## 6N137
designator U?
HIGH SPEED-10 MBit/s  LOGIC GATE OPTOCOUPLERS; Designer: Saeid Jorablo; Company: ControTEK; Adding Date: 1387/01/08
footprint DIP8
pins: 1 NC, 2 A, 3 K, 4 NC, 5 GND, 6 Vo, 7 Ve, 8 VCC

## 24c64
designator U?
64 Kbit Serial I²C Bus EEPROM; Manufacturer: ST-Microelectronics; Class: Memory; Published: 24/08/2001; Publisher: Altium Hobart Technology Centre; SubClass: EEPROM; Series: Serial
footprint My_DIP8
3D model 8p3 (PCB3D Model)
footprint SOIC127P600-8M (SOIC, 8-Leads, Body 4.9x3.9mm, Pitch 1.27mm, IPC Low Density)
footprint SOIC127P600-8L (SOIC, 8-Leads, Body 4.9x3.9mm, Pitch 1.27mm, IPC High Density)
pins: 1 E0 (in), 2 E1 (in), 3 E2 (in), 4 GND (power), 5 SDA (io), 6 SCL (in), 7 ~{WC} (in), 8 VCC (power)

## 74HC14D
designator U?
Hex Schmitt-Trigger Inverter; Published: 8-Jun-2000; LatestRevisionDate: 13-Apr-2006; LatestRevisionNote: IPC-7351 Footprint Added.; DatasheetVersion: May-1997; PackageVersion: Jan-1998; PackageReference: D014; Publisher: Altium Limited; PackageDescription: 14-Pin Small Outline Integrated Circuit 1.27 mm Pitch; Code_IPC: SOIC127P600-14; ComponentLink1Description: Manufacturer Link; ComponentLink1URL: http://www.ti.com/; ComponentLink2Description: Datasheet; ComponentLink2URL: http://www-s.ti.com/sc/ds/sn74hc14.pdf
footprint D014_N (SOIC, 14-Leads, Body 8.7x3.9mm, Pitch 1.27mm, IPC Medium Density)
footprint D014_L (SOIC, 14-Leads, Body 8.7x3.9mm, Pitch 1.27mm, IPC High Density)
footprint D014_M (SOIC, 14-Leads, Body 8.7x3.9mm, Pitch 1.27mm, IPC Low Density)
3D model D014 (14-Pin Small Outline Integrated Circuit 1.27 mm Pitch)
signal-integrity model SN74HC14D
footprint TSSOP-14
footprint DIP14
part A pins: 1 A (in), 2 Y (out), 7 GND (power), 14 VCC (power)
part B pins: 3 A (in), 4 Y (out)
part C pins: 5 A (in), 6 Y (out)
part D pins: 8 Y (out), 9 A (in)
part E pins: 10 Y (out), 11 A (in)
part F pins: 12 Y (out), 13 A (in)

## 74HC4067
designator U?
16-channel analog multiplexer/demultiplexer; PackageDocument: 2000; Published: 15-Apr-2002; LatestRevisionDate: 06-Jun-2005; LatestRevisionNote: Stylized 3D Model Added.; DatasheetDocument: Jun-1989; PackageReference: N24A; Publisher: Altium Limited; ComponentLink1Description: Manufacturer Link; ComponentLink1URL: http://www.national.com/; ComponentLink2Description: Datasheet; ComponentLink2URL: http://www.national.com/ds.cgi/54/54154.pdf; ComponentLink3Description: URL Link1; ComponentLink3URL: http://www.national.com/pf/DM/DM54154.html
footprint N24A (DIP; 24 Leads; Row Spacing 15.24 mm; Pitch 2.54 mm)
pins: 1 Z (out), 2 ~{Y}7 (in), 3 ~{Y}6 (in), 4 ~{Y}5 (in), 5 ~{Y}4 (in), 6 ~{Y}3 (in), 7 ~{Y}2 (in), 8 ~{Y}1 (in), 9 ~{Y}0 (in), 10 A (in), 11 B (in), 12 GND (power), 13 D (in), 14 C (in), 15 ~{E} (in), 16 ~{Y}15 (in), 17 ~{Y}14 (in), 18 ~{Y}13 (in), 19 ~{Y}12 (in), 20 ~{Y}11 (in), 21 ~{Y}10 (in), 22 ~{Y}9 (in), 23 ~{Y}8 (in), 24 VCC (power)

## 74LS14D
designator U?
Hex Schmitt-Trigger Inverter; Published: 8-Jun-2000; LatestRevisionDate: 13-Apr-2006; LatestRevisionNote: IPC-7351 Footprint Added.; DatasheetVersion: Mar-1988; PackageVersion: Jan-1998; PackageReference: D014; Publisher: Altium Limited; PackageDescription: 14-Pin Small Outline Integrated Circuit 1.27 mm Pitch; Code_IPC: SOIC127P600-14; ComponentLink1Description: Manufacturer Link; ComponentLink1URL: http://www.ti.com/; ComponentLink2Description: Datasheet; ComponentLink2URL: http://www-s.ti.com/sc/ds/sn74ls14.pdf
footprint D014_N (SOIC, 14-Leads, Body 8.7x3.9mm, Pitch 1.27mm, IPC Medium Density)
footprint D014_L (SOIC, 14-Leads, Body 8.7x3.9mm, Pitch 1.27mm, IPC High Density)
footprint D014_M (SOIC, 14-Leads, Body 8.7x3.9mm, Pitch 1.27mm, IPC Low Density)
3D model D014 (14-Pin Small Outline Integrated Circuit 1.27 mm Pitch)
simulation model SN74LS14 (SIMCODE)
signal-integrity model SN74LS14D
part A pins: 1 A (in), 2 Y (out), 7 GND (power), 14 VCC (power)
part B pins: 3 A (in), 4 Y (out)
part C pins: 5 A (in), 6 Y (out)
part D pins: 8 Y (out), 9 A (in)
part E pins: 10 Y (out), 11 A (in)
part F pins: 12 Y (out), 13 A (in)

## 74LS74AN
designator U?
Dual D-Type Positive-Edge-Triggered Flip-Flop with Preset and Clear; Published: 8-Jun-2000; LatestRevisionDate: 04-Mar-2005; LatestRevisionNote: Stylized 3D Model Added.; DatasheetVersion: Mar-1988; PackageVersion: Oct-1995; PackageReference: N014D; Publisher: Altium Limited; PackageDescription: DIP; 14 Leads; Row Spacing 7.62 mm; Pitch 2.54 mm; ComponentLink1Description: Manufacturer Link; ComponentLink1URL: http://www.ti.com/; ComponentLink2Description: Datasheet; ComponentLink2URL: http://www-s.ti.com/sc/ds/sn74ls74a.pdf
footprint N014D (DIP; 14 Leads; Row Spacing 7.62 mm; Pitch 2.54 mm)
3D model N014 (DIP; 14 Leads; Row Spacing 7.62 mm; Pitch 2.54 mm)
simulation model SN74LS74 (SIMCODE)
signal-integrity model SN74LS74AN
pins on every part: 7 GND (power) hidden to GND, 14 VCC (power) hidden to VCC
part A pins: 1 CLR (in), 2 D (in), 3 CLK (in), 4 PR (in), 5 Q (out), 6 ~{Q} (out)
part B pins: 8 ~{Q} (out), 9 Q (out), 10 PR (in), 11 CLK (in), 12 D (in), 13 CLR (in)

## 74LS90N
designator U?
Decade Counter; Note: Pins 4 and 13 are NC & are not drawn.; Published: 8-Jun-2000; LatestRevisionDate: 04-Mar-2005; LatestRevisionNote: Stylized 3D Model Added.; DatasheetVersion: Mar-1988; PackageVersion: Oct-1995; PackageReference: N014D; Publisher: Altium Limited; PackageDescription: DIP; 14 Leads; Row Spacing 7.62 mm; Pitch 2.54 mm; ComponentLink1Description: Manufacturer Link; ComponentLink1URL: http://www.ti.com/; ComponentLink2Description: Datasheet; ComponentLink2URL: http://www-s.ti.com/sc/ds/sn74ls92.pdf
footprint DIP-14 (DIP; 14 Leads; Row Spacing 7.62 mm; Pitch 2.54 mm)
pins: 1 CKB (in), 2 R0(1) (in), 3 R0(2) (in), 5 VCC (power), 6 R9(1) (in), 7 R9(2) (in), 8 QC (out), 9 QB (out), 10 GND (power), 11 QD (out), 12 QA (out), 14 CKA (in)

## 74LVC1T45
designator IC?
Single-BIT Dual-Supply bus Transiver; Company: MY; Selling Source: Iranmicro.ir; Design Date: 12/02/2011
footprint TSOP95P280X145-6N (TSOP, 6-Leads, Body 3.0x1.8mm (max), Pitch 0.95mm, IPC Medium Density)
footprint TSOP65P210X110-6N (TSOP, 6-Leads, Body 2.2x1.4mm (max), Pitch 0.65mm, IPC Medium Density)
pins: 1 VCCA (power), 2 GND (power), 3 A (hiz), 4 B (hiz), 5 DIR (hiz), 6 VCCB (power)

## 74LVC2G07
designator U?, comment 74LVC2
Buffers with open-drain outputs
footprint SOT457
pins: 1 A (in), 2 GND, 3 A (in), 4 Y (out), 5 VCC, 6 Y (out)